# Altium footprint library IC.PCBLIB: 359 footprints (part 14 of 23)
Each footprint in its own frame and in the unit in brackets; x right, y up, seen from the top. Pads: shape width x height; smd on the part's side, far side on the other; paste and mask are expansions set on the pad; w line width, h text height; cw(c..) or ccw(c..) is an arc to the next point about the centre after c.
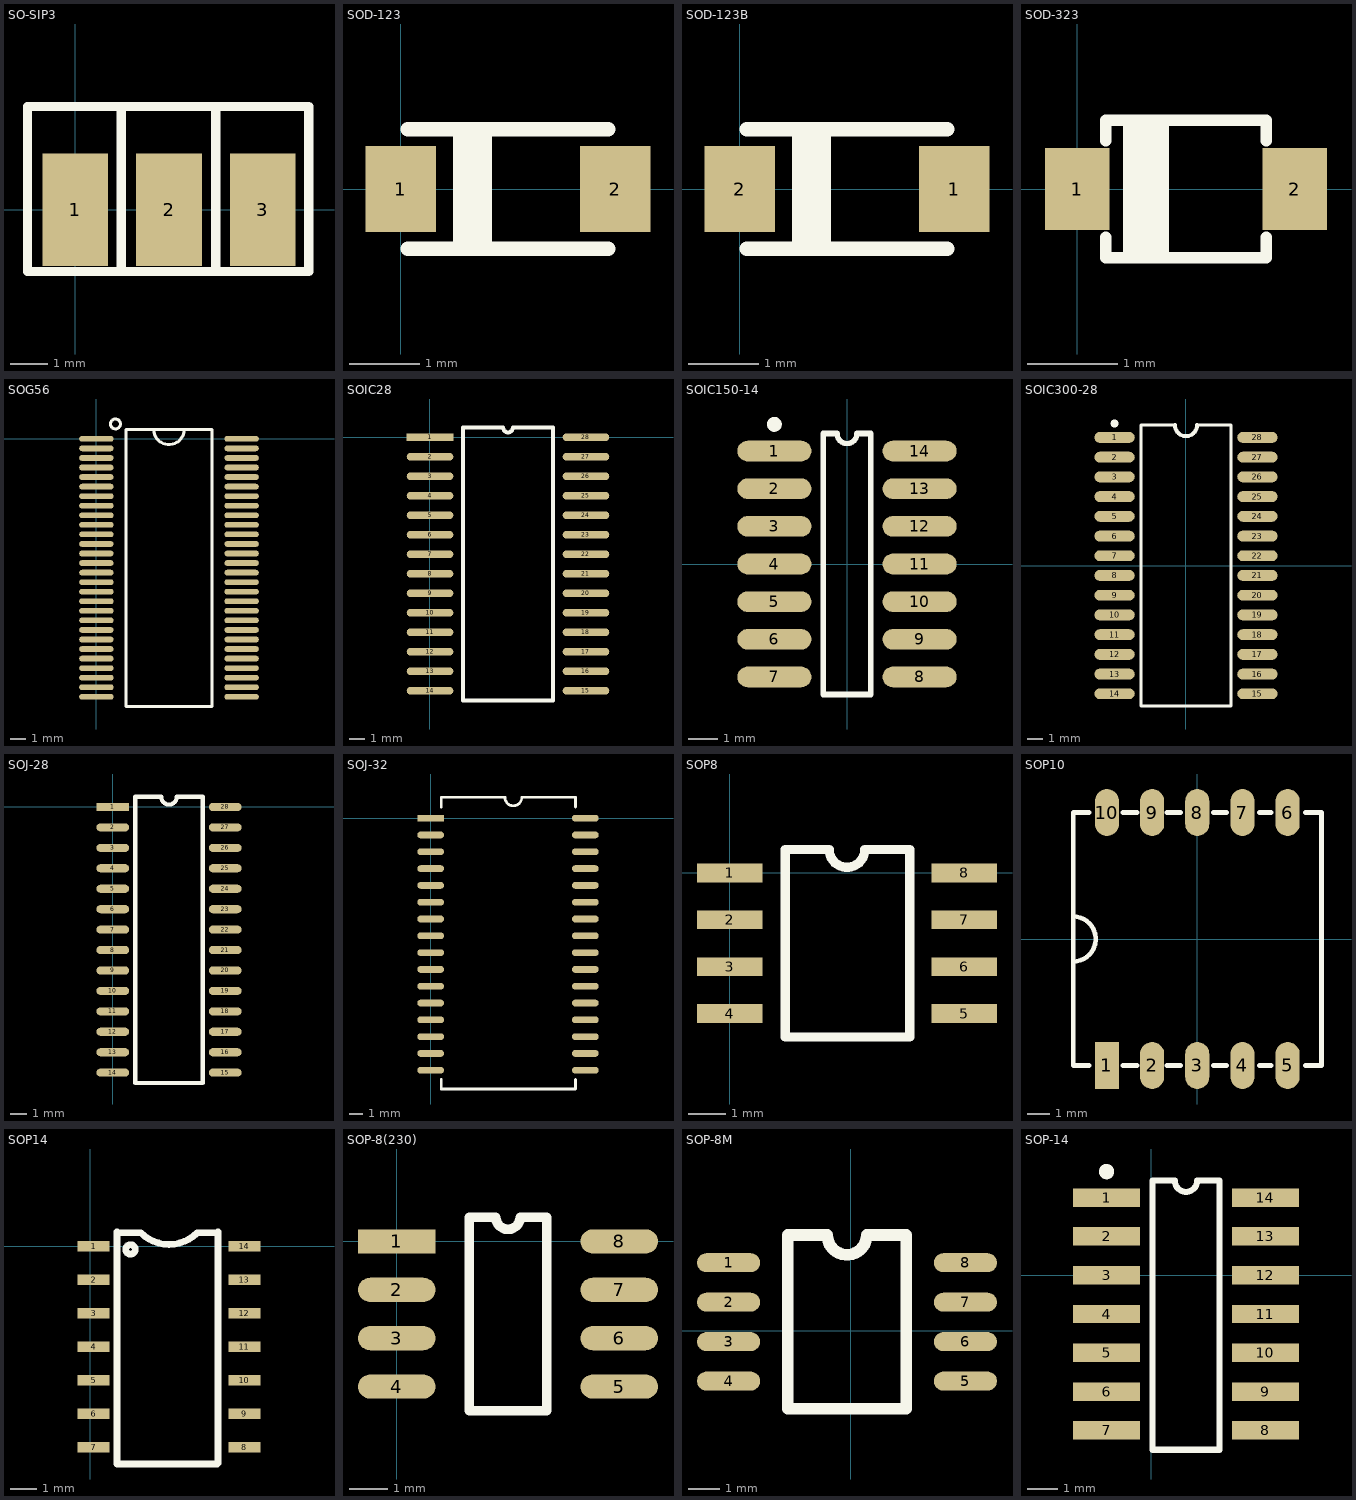
[diagram p13: the footprints below, top view; thin cyan lines are the x and y axes]

## SO-SIP3 [mil]
pads (3):
  rect 70x120 smd: 1(0,0) 2(100,0) 3(200,0)
TopOverlay:
  lines w10: 49,-66 49,109 ; 150,-65 150,110 ; 249,109 249,-66 -51,-66 -51,110 249,110

## SOD-123 [mm]
height 1.524
pads (2):
  rect 1x1.22 smd: 1(0,0) 2(3.048,0)
TopOverlay:
  lines w0.203: 0.099,-0.85 2.949,-0.85 ; 0.099,0.85 2.949,0.85 ; 0.841,-0.85 0.841,0.85 ; 1.019,-0.85 1.019,0.85 ; 1.197,-0.85 1.197,0.85

## SOD-123B [mm]
height 1.524
pads (2):
  rect 1x1.22 smd: 1(3.048,0) 2(0,0)
TopOverlay:
  lines w0.203: 0.099,-0.85 2.949,-0.85 ; 0.099,0.85 2.949,0.85 ; 0.841,-0.85 0.841,0.85 ; 1.019,-0.85 1.019,0.85 ; 1.197,-0.85 1.197,0.85

## SOD-323 [mil]
height 38
pads (2):
  rect 28x36 smd: 1(0,0) 2(95,0)
TopOverlay:
  lines w5: 12.5,-21 12.5,-30 82.5,-30 82.5,-21 ; 12.5,21 12.5,30 82.5,30 82.5,21 ; 22.5,-30 22.5,30 ; 27.5,-30 27.5,30 ; 32.5,-30 32.5,30 ; 37.5,-30 37.5,30

## SOG56 [mil]
pads (56):
  oval 90x15 smd: 1(0,0) 2(0,-25) 3(0,-50) 4(0,-75) 5(0,-100) 6(0,-125) 7(0,-150) 8(0,-175) 9(0,-200) 10(0,-225) 11(0,-250) 12(0,-275) 13(0,-300) 14(0,-325) 15(0,-350) 16(0,-375) 17(0,-400) 18(0,-425) 19(0,-450) 20(0,-475) 21(0,-500) 22(0,-525) 23(0,-550) 24(0,-575) 25(0,-600) 26(0,-625) 27(0,-650) 28(0,-675) 29(380,-675) 30(380,-650) 31(380,-625) 32(380,-600) 33(380,-575) 34(380,-550) 35(380,-525) 36(380,-500) 37(380,-475) 38(380,-450) 39(380,-425) 40(380,-400) 41(380,-375) 42(380,-350) 43(380,-325) 44(380,-300) 45(380,-275) 46(380,-250) 47(380,-225) 48(380,-200) 49(380,-175) 50(380,-150) 51(380,-125) 52(380,-100) 53(380,-75) 54(380,-50) 55(380,-25) 56(380,0)
TopOverlay:
  circle w8: c49.96,39 r13.04
  lines w8: 149.88,25 ccw(c189.88,25) 229.88,25 ; 78,-700 302,-700 302,25 78,25 78,-700

## SOIC28 [mil]
pads (28):
  rect 119.37x20 smd: 1(0.2,0.12)
  oval 119.37x20 smd: 2(0.2,-49.88) 3(0.2,-99.88) 4(0.2,-149.88) 5(0.2,-199.88) 6(0.2,-249.88) 7(0.2,-299.88) 8(0.2,-349.88) 9(0.2,-399.88) 10(0.2,-449.88) 11(0.2,-499.88) 12(0.2,-549.88) 13(0.2,-599.88) 14(0.2,-649.88) 15(400.2,-649.88) 16(400.2,-599.88) 17(400.2,-549.88) 18(400.2,-499.88) 19(400.2,-449.88) 20(400.2,-399.88) 21(400.2,-349.88) 22(400.2,-299.88) 23(400.2,-249.88) 24(400.2,-199.88) 25(400.2,-149.88) 26(400.2,-99.88) 27(400.2,-49.88) 28(400.2,0.12)
TopOverlay:
  lines w10: 85.2,-674.88 315.2,-674.88 315.2,25.12 212.7,25.12 cw(c200.2,25.12) 187.7,25.12 85.2,25.12 85.2,-674.88

## SOIC150-14 [mm] "SOIC, 14-Leads, Body 8.7x3.9mm, Pitch 1.27mm, IPC Low Density"
height 1.76
pads (14):
  oval 2.5x0.7 smd: 1(-2.45,3.81) 2(-2.45,2.54) 3(-2.45,1.27) 4(-2.45,0) 5(-2.45,-1.27) 6(-2.45,-2.54) 7(-2.45,-3.81) 8(2.45,-3.81) 9(2.45,-2.54) 10(2.45,-1.27) 11(2.45,0) 12(2.45,1.27) 13(2.45,2.54) 14(2.45,3.81)
TopOverlay:
  circle w0.25: c-2.45,4.71 r0.125
  lines w0.178: -0.336,4.4 ccw(c0,4.4) 0.336,4.4
  lines w0.2: -0.8,4.4 -0.8,-4.4 0.8,-4.4 0.8,4.4
  lines w0.203: -0.8,4.4 -0.336,4.4 ; 0.336,4.4 0.8,4.4

## SOIC300-28 [mm] "SOIC, 28-Leads, Body 17.9x7.5mm, Pitch 1.27mm, IPC Low Density"
height 2.65
pads (28):
  oval 2.6x0.7 smd: 1(-4.6,8.255) 2(-4.6,6.985) 3(-4.6,5.715) 4(-4.6,4.445) 5(-4.6,3.175) 6(-4.6,1.905) 7(-4.6,0.635) 8(-4.6,-0.635) 9(-4.6,-1.905) 10(-4.6,-3.175) 11(-4.6,-4.445) 12(-4.6,-5.715) 13(-4.6,-6.985) 14(-4.6,-8.255) 15(4.6,-8.255) 16(4.6,-6.985) 17(4.6,-5.715) 18(4.6,-4.445) 19(4.6,-3.175) 20(4.6,-1.905) 21(4.6,-0.635) 22(4.6,0.635) 23(4.6,1.905) 24(4.6,3.175) 25(4.6,4.445) 26(4.6,5.715) 27(4.6,6.985) 28(4.6,8.255)
TopOverlay:
  circle w0.25: c-4.6,9.155 r0.125
  lines w0.2: -2.9,9.05 -2.9,-9.05 2.9,-9.05 2.9,9.05
  lines w0.203: -2.9,9.05 -0.715,9.05 ; 0.715,9.05 2.9,9.05
  lines w0.254: -0.715,9.05 ccw(c0,9.05) 0.715,9.05

## SOJ-28 [mil]
pads (28):
  rect 80x20 smd: 1(0,0)
  oval 80x20 smd: 2(0,-50) 3(0,-100) 4(0,-150) 5(0,-200) 6(0,-250) 7(0,-300) 8(0,-350) 9(0,-400) 10(0,-450) 11(0,-500) 12(0,-550) 13(0,-600) 14(0,-650) 15(275,-650) 16(275,-600) 17(275,-550) 18(275,-500) 19(275,-450) 20(275,-400) 21(275,-350) 22(275,-300) 23(275,-250) 24(275,-200) 25(275,-150) 26(275,-100) 27(275,-50) 28(275,0)
TopOverlay:
  lines w10: 55,-675 220,-675 220,25 156.51,25 cw(c137.5,25) 118.49,25 55,25 55,-675

## SOJ-32 [mil]
pads (32):
  rect 80x20 smd: 1(0,0)
  oval 80x20 smd: 2(0,-50) 3(0,-100) 4(0,-150) 5(0,-200) 6(0,-250) 7(0,-300) 8(0,-350) 9(0,-400) 10(0,-450) 11(0,-500) 12(0,-550) 13(0,-600) 14(0,-650) 15(0,-700) 16(0,-750) 17(460,-750) 18(460,-700) 19(460,-650) 20(460,-600) 21(460,-550) 22(460,-500) 23(460,-450) 24(460,-400) 25(460,-350) 26(460,-300) 27(460,-250) 28(460,-200) 29(460,-150) 30(460,-100) 31(460,-50) 32(460,0)
TopOverlay:
  lines w7.87: 30.87,-777.47 30.87,-805.81 430.94,-805.81 430.94,-777.47 ; 30.87,33.47 30.87,61.81 220.91,61.81 ccw(c245.91,61.81) 270.9,61.81 430.94,61.81 430.94,33.47

## SOP8 [mil]
pads (8):
  rect 70x20 smd: 1(0,0) 2(0,-50) 3(0,-100) 4(0,-150) 5(250,-150) 6(250,-100) 7(250,-50) 8(250,0)
TopOverlay:
  lines w10: 144,25 cw(c125,25) 106,25 59,25 59,-175 192,-175 192,25 145,25
3D body: height 80, standoff 10, extent 56,-176 192,27

## SOP10 [mil]
height 80
pads (10):
  rect 42x82 smd: 1(-157.48,-220.47)
  oval 42x82 smd: 2(-78.74,-220.47) 3(0,-220.47) 4(78.74,-220.47) 5(157.48,-220.47) 6(157.48,220.47) 7(78.74,220.47) 8(0,220.47) 9(-78.74,220.47) 10(-157.48,220.47)
TopOverlay:
  lines w8: -216.54,-39.37 ccw(c-216.54,0) -216.54,39.37 ; -188,-220.47 -216.54,-220.47 -216.54,220.47 -188,220.47 ; -130,-220.47 -105,-220.47 ; -130,220.47 -105,220.47 ; -53,-220.47 -29,-220.47 ; -53,220.47 -29,220.47 ; 28,-220.47 51,-220.47 ; 28,220.47 51,220.47 ; 108,-220.47 129,-220.47 ; 108,220.47 129,220.47 ; 188,-220.47 216.54,-220.47 216.54,220.47 188,220.47

## SOP14 [mm]
pads (14):
  rect 1.2x0.4 smd: 1(0.127,0) 2(0.127,-1.27) 3(0.127,-2.54) 4(0.127,-3.81) 5(0.127,-5.08) 6(0.127,-6.35) 7(0.127,-7.62) 8(5.842,-7.62) 9(5.842,-6.35) 10(5.842,-5.08) 11(5.842,-3.81) 12(5.842,-2.54) 13(5.842,-1.27) 14(5.842,0)
TopOverlay:
  circle w0.254: c1.524,-0.127 r0.18
  lines w0.254: 1.016,-8.255 4.813,-8.255 4.844,-8.224 4.844,0.539 4.813,0.508 4.064,0.508 cw(c2.986,1.586) 1.909,0.508 1.047,0.508 1.016,0.539 1.016,-8.255

## SOP-8(230) [mil]
pads (8):
  rect 80x25 smd: 1(0,0)
  oval 80x25 smd: 2(0,-50) 3(0,-100) 4(0,-150) 5(230,-150) 6(230,-100) 7(230,-50) 8(230,0)
TopOverlay:
  lines w10: 75,-175 155,-175 155,25 127.5,25 cw(c115,25) 102.5,25 75,25 75,-175

## SOP-8M [mil]
pads (8):
  oval 80x24 smd: 1(-155,86) 2(-155,36) 3(-155,-14) 4(-155,-64) 5(145,-64) 6(145,-14) 7(145,36) 8(145,86)
TopOverlay:
  lines w15: -80,-99 70,-99 70,121 20,121 cw(c-5,121) -30,121 -80,121 -80,-99

## SOP-14 [mm]
pads (14):
  rect 2.2x0.6 smd: 1(-1.457,2.54) 2(-1.457,1.27) 3(-1.457,0) 4(-1.457,-1.27) 5(-1.457,-2.54) 6(-1.457,-3.81) 7(-1.457,-5.08) 8(3.743,-5.08) 9(3.743,-3.81) 10(3.743,-2.54) 11(3.743,-1.27) 12(3.743,0) 13(3.743,1.27) 14(3.743,2.54)
TopOverlay:
  circle w0.25: c-1.457,3.39 r0.125
  lines w0.2: 0.043,-5.715 0.043,3.095 0.776,3.095 ccw(c1.143,3.095) 1.51,3.095 2.243,3.095 2.243,-5.715 0.043,-5.715